# Altium footprint library 3.22-杂项.PcbLib: 199 footprints (part 10 of 15)
Each footprint in its own frame and in the unit in brackets; x right, y up, seen from the top. Pads: shape width x height; smd on the part's side, far side on the other; paste and mask are expansions set on the pad; w line width, h text height; cw(c..) or ccw(c..) is an arc to the next point about the centre after c.
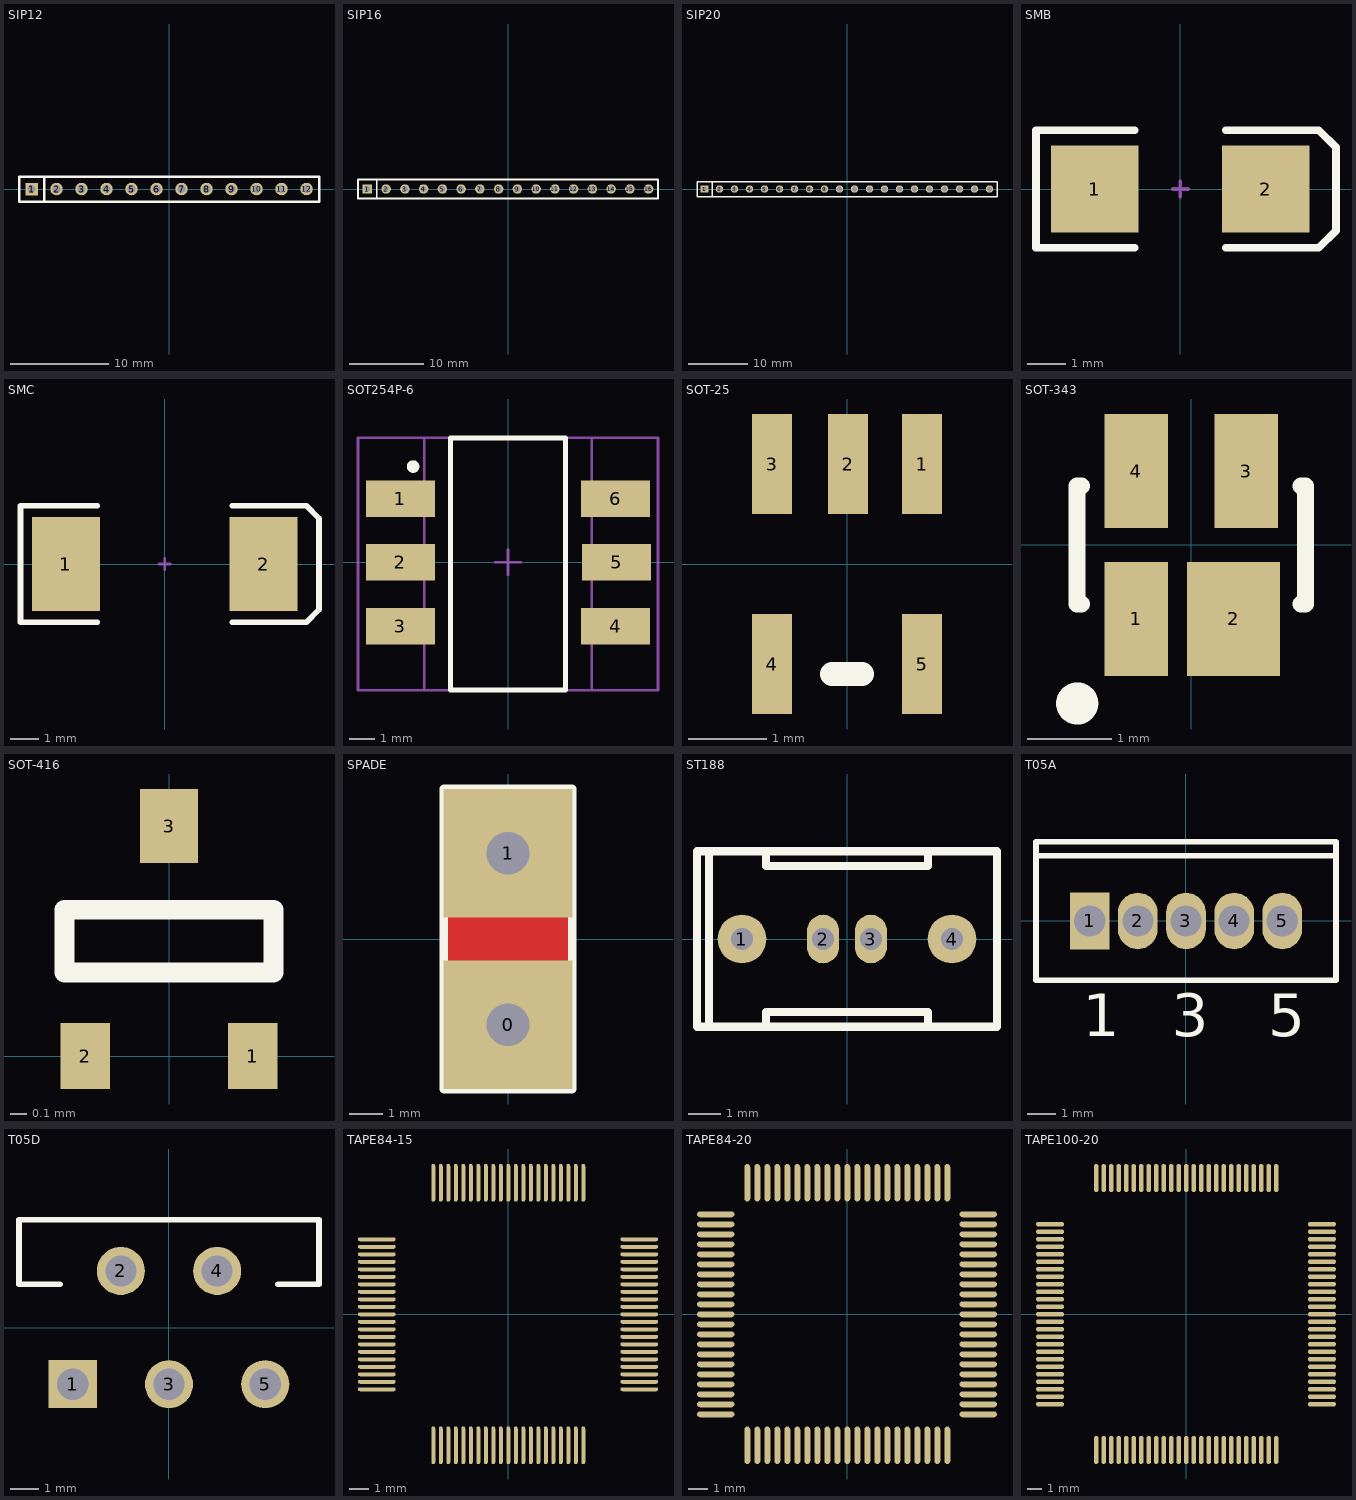
[diagram p9: the footprints below, top view; thin cyan lines are the x and y axes]

## SIP12 [mil] "[ PCBѧϰȺ514746572 ]"
pads (12):
  rect 50x50 hole 32: 1(-550,0)
  round 50 hole 32: 2(-450,0) 3(-350,0) 4(-250,0) 5(-150,0) 6(-50,0) 7(50,0) 8(150,0) 9(250,0) 10(350,0) 11(450,0) 12(550,0)
Top Overlay:
  lines w10: -500,-50 -500,50 ; -600,-50 600,-50 600,50 -600,50 -600,-50

## SIP16 [mil] "[ PCBѧϰȺ514746572 ]"
pads (16):
  rect 50x50 hole 32: 1(-750,0)
  round 50 hole 32: 2(-650,0) 3(-550,0) 4(-450,0) 5(-350,0) 6(-250,0) 7(-150,0) 8(-50,0) 9(50,0) 10(150,0) 11(250,0) 12(350,0) 13(450,0) 14(550,0) 15(650,0) 16(750,0)
Top Overlay:
  lines w10: -700,-50 -700,50 ; -800,-50 -800,50 800,50 800,-50 -800,-50

## SIP20 [mil] "[ PCBѧϰȺ514746572 ]"
pads (20):
  rect 50x50 hole 32: 1(-950,0)
  round 50 hole 32: 2(-850,0) 3(-750,0) 4(-650,0) 5(-550,0) 6(-450,0) 7(-350,0) 8(-250,0) 9(-150,0) 10(-50,0) 11(50,0) 12(150,0) 13(250,0) 14(350,0) 15(450,0) 16(550,0) 17(650,0) 18(750,0) 19(850,0) 20(950,0)
Top Overlay:
  lines w10: -900,-50 -900,50 ; -1000,-50 -1000,50 1000,50 1000,-50 -1000,-50

## SMB [mm] "DO-214-AA/SMB; 2 C-Bend Leads; Body 5.3 x 3.6 mm, inc. leads (LxW)      [ PCBѧϰȺ514746572 ]"
height 2.54
pads (2):
  rect 2.3x2.3 smd: 1(-2.25,0) 2(2.25,0)
Top Overlay:
  lines w0.2: -1.2,-1.55 -3.8,-1.55 -3.8,1.55 -1.2,1.55 ; 1.2,-1.55 3.65,-1.55 4.1,-1.1 4.1,1.1 3.65,1.55 1.2,1.55
Mechanical 1:
  lines w0.1: -0.2,0 0.2,0 ; 0,-0.2 0,0.2

## SMC [mm] "DO-214-AB/SMC; 2 C-Bend Leads; Body 7.9 x 5.9 mm, inc. leads (LxW)      [ PCBѧϰȺ514746572 ]"
height 2.65
pads (2):
  rect 2.4x3.3 smd: 1(-3.475,0) 2(3.475,0)
Top Overlay:
  lines w0.2: -2.375,-2.05 -5.075,-2.05 -5.075,2.05 -2.375,2.05 ; 2.375,-2.05 4.975,-2.05 5.425,-1.6 5.425,1.6 4.975,2.055 ; 2.375,2.05 4.975,2.05
Mechanical 1:
  lines w0.1: -0.2,0 0.2,0 ; 0,-0.2 0,0.2

## SOT254P-6 [mm] "继电器      [ PCB学习群514746572 ]"
height 3.8
pads (6):
  rect 2.75x1.45 smd: 1(-4.283,2.54) 2(-4.283,0) 3(-4.283,-2.54) 4(4.283,-2.54) 5(4.318,0) 6(4.283,2.54)
Top Overlay:
  circle w0.25: c-3.775,3.815 r0.125
  lines w0.2: -2.286,-5.08 -2.286,4.953 2.286,4.953 2.286,-5.08 -2.286,-5.08
Mechanical 13:
  lines w0.1: -3.325,-5.08 3.325,-5.08 3.325,4.953 -3.325,4.953 -3.325,-5.08
Mechanical 15:
  lines w0.1: -0.5,0 0.5,0 ; 0,-0.5 0,0.5 ; -5.969,-5.08 5.969,-5.08 5.969,4.953 -5.969,4.953 -5.969,-5.08
3D body: height 3.8, standoff 0.05, extent -3.325,-5.08 3.325,4.953

## SOT-25 [mil] "[ PCBѧϰȺ514746572 ]"
pads (5):
  rect 20x50 smd: 1(37.5,50) 2(0.5,50) 3(-37.5,50) 4(-37.5,-50) 5(37.5,-50)
Top Overlay:
  lines w12: -7.5,-55 7.5,-55

## SOT-343 [mm] "SOT-343; 4 Leads; Body 2.2 x 2.2 mm, inc. leads (LxW max)      [ PCBѧϰȺ514746572 ]"
height 1
pads (4):
  rect 0.75x1.35 smd: 1(-0.65,-0.875) 3(0.65,0.875) 4(-0.65,0.875)
  rect 1.1x1.35 smd: 2(0.5,-0.875)
Top Overlay:
  circle w0.25: c-1.35,-1.875 r0.125
  lines w0.2: -1.3,-0.7 -1.35,-0.7 -1.35,0.7 -1.3,0.7 ; 1.3,-0.7 1.35,-0.7 1.35,0.7 1.3,0.7

## SOT-416 [mm] "[ PCBѧϰȺ514746572 ]"
height 0.7
pads (3):
  rect 0.3x0.4 smd: 1(0.508,0) 2(-0.508,0)
  rect 0.35x0.45 smd: 3(0,1.397)
Top Overlay:
  lines w0.12: -0.635,0.508 -0.635,0.889 0.635,0.889 0.635,0.508 -0.635,0.508

## SPADE [mil] "[ PCBѧϰȺ514746572 ]"
pads (2):
  rect 150x150 hole 50: 0(0,-100) 1(0,100)
Top Layer:
  rectangle: -75,-50 75,50
Bottom Layer:
  rectangle: -75,-50 75,50
Top Overlay:
  lines w10: -75,-175 75,-175 75,175 -75,175 -75,-175

## ST188 [mm] "反射式光电传感器      [ PCB学习群514746572 ]"
height 8.2
pads (4):
  round 1.524 hole 0.7: 1(-3.29,0) 4(3.29,0)
  oval 1x1.524 hole 0.7: 2(-0.75,0) 3(0.75,0)
Top Overlay:
  lines w0.254: -4.318,-2.75 -4.318,2.75 ; -2.54,-2.75 -2.54,-2.286 2.54,-2.286 2.54,-2.75 ; -2.54,2.75 -2.54,2.286 2.54,2.286 2.54,2.75 ; -4.7,-2.75 4.7,-2.75 4.7,2.75 -4.7,2.75 -4.7,-2.75

## T05A [mm] "TO, Thru-Hole, Vertical, Heatsink Mounted; 5 In-Line Leads; Pitch 1.70 mm      [ PCBѧϰȺ514746572 ]"
height 15.9
pads (5):
  rect 1.4x2 hole 1.1: 1(-3.4,0)
  oval 1.4x2 hole 1.1: 2(-1.7,0) 3(0,0) 4(1.7,0) 5(3.4,0)
Top Overlay:
  lines w0.2: -5.3,2.3 5.3,2.3 ; -5.3,-2.1 -5.3,2.8 5.3,2.8 5.3,-2.1 -5.3,-2.1
  text "5" at 2.9,-4.075 h1.5
  text "3" at -0.5,-4.075 h1.5
  text "1" at -3.65,-4.075 h1.5

## T05D [mm] "[ PCBѧϰȺ514746572 ]"
height 21.1
pads (5):
  rect 1.7x1.7 hole 1.1: 1(-3.4,-2)
  round 1.7 hole 1.1: 2(-1.7,2) 3(0,-2) 4(1.7,2) 5(3.4,-2)
Top Overlay:
  lines w0.2: -3.854,1.53 -5.3,1.53 -5.3,3.81 5.3,3.81 5.3,1.53 3.854,1.53

## TAPE84-15 [mil] "[ PCBѧϰȺ514746572 ]"
pads (84):
  oval 75x8 smd: 1(-262.5,149.5) 2(-262.5,134.5) 3(-262.5,119.5) 4(-262.5,104.5) 5(-262.5,89.5) 6(-262.5,74.5) 7(-262.5,59.5) 8(-262.5,44.5) 9(-262.5,29.5) 10(-262.5,14.5) 11(-262.5,-0.5) 12(-262.5,-15.5) 13(-262.5,-30.5) 14(-262.5,-45.5) 15(-262.5,-60.5) 16(-262.5,-75.5) 17(-262.5,-90.5) 18(-262.5,-105.5) 19(-262.5,-120.5) 20(-262.5,-135.5) 21(-262.5,-150.5) 43(262.5,-150.5) 44(262.5,-135.5) 45(262.5,-120.5) 46(262.5,-105.5) 47(262.5,-90.5) 48(262.5,-75.5) 49(262.5,-60.5) 50(262.5,-45.5) 51(262.5,-30.5) 52(262.5,-15.5) 53(262.5,-0.5) 54(262.5,14.5) 55(262.5,29.5) 56(262.5,44.5) 57(262.5,59.5) 58(262.5,74.5) 59(262.5,89.5) 60(262.5,104.5) 61(262.5,119.5) 62(262.5,134.5) 63(262.5,149.5)
  oval 8x75 smd: 22(-149.5,-262.5) 23(-134.5,-262.5) 24(-119.5,-262.5) 25(-104.5,-262.5) 26(-89.5,-262.5) 27(-74.5,-262.5) 28(-59.5,-262.5) 29(-44.5,-262.5) 30(-29.5,-262.5) 31(-14.5,-262.5) 32(0.5,-262.5) 33(15.5,-262.5) 34(30.5,-262.5) 35(45.5,-262.5) 36(60.5,-262.5) 37(75.5,-262.5) 38(90.5,-262.5) 39(105.5,-262.5) 40(120.5,-262.5) 41(135.5,-262.5) 42(150.5,-262.5) 64(150.5,262.5) 65(135.5,262.5) 66(120.5,262.5) 67(105.5,262.5) 68(90.5,262.5) 69(75.5,262.5) 70(60.5,262.5) 71(45.5,262.5) 72(30.5,262.5) 73(15.5,262.5) 74(0.5,262.5) 75(-14.5,262.5) 76(-29.5,262.5) 77(-44.5,262.5) 78(-59.5,262.5) 79(-74.5,262.5) 80(-89.5,262.5) 81(-104.5,262.5) 82(-119.5,262.5) 83(-134.5,262.5) 84(-149.5,262.5)

## TAPE84-20 [mil] "[ PCBѧϰȺ514746572 ]"
pads (84):
  oval 75x12 smd: 1(-262.5,199.5) 2(-262.5,179.5) 3(-262.5,159.5) 4(-262.5,139.5) 5(-262.5,119.5) 6(-262.5,99.5) 7(-262.5,79.5) 8(-262.5,59.5) 9(-262.5,39.5) 10(-262.5,19.5) 11(-262.5,-0.5) 12(-262.5,-20.5) 13(-262.5,-40.5) 14(-262.5,-60.5) 15(-262.5,-80.5) 16(-262.5,-100.5) 17(-262.5,-120.5) 18(-262.5,-140.5) 19(-262.5,-160.5) 20(-262.5,-180.5) 21(-262.5,-200.5) 43(262.5,-200.5) 44(262.5,-180.5) 45(262.5,-160.5) 46(262.5,-140.5) 47(262.5,-120.5) 48(262.5,-100.5) 49(262.5,-80.5) 50(262.5,-60.5) 51(262.5,-40.5) 52(262.5,-20.5) 53(262.5,-0.5) 54(262.5,19.5) 55(262.5,39.5) 56(262.5,59.5) 57(262.5,79.5) 58(262.5,99.5) 59(262.5,119.5) 60(262.5,139.5) 61(262.5,159.5) 62(262.5,179.5) 63(262.5,199.5)
  oval 12x75 smd: 22(-199.5,-262.5) 23(-179.5,-262.5) 24(-159.5,-262.5) 25(-139.5,-262.5) 26(-119.5,-262.5) 27(-99.5,-262.5) 28(-79.5,-262.5) 29(-59.5,-262.5) 30(-39.5,-262.5) 31(-19.5,-262.5) 32(0.5,-262.5) 33(20.5,-262.5) 34(40.5,-262.5) 35(60.5,-262.5) 36(80.5,-262.5) 37(100.5,-262.5) 38(120.5,-262.5) 39(140.5,-262.5) 40(160.5,-262.5) 41(180.5,-262.5) 42(200.5,-262.5) 64(200.5,262.5) 65(180.5,262.5) 66(160.5,262.5) 67(140.5,262.5) 68(120.5,262.5) 69(100.5,262.5) 70(80.5,262.5) 71(60.5,262.5) 72(40.5,262.5) 73(20.5,262.5) 74(0.5,262.5) 75(-19.5,262.5) 76(-39.5,262.5) 77(-59.5,262.5) 78(-79.5,262.5) 79(-99.5,262.5) 80(-119.5,262.5) 81(-139.5,262.5) 82(-159.5,262.5) 83(-179.5,262.5) 84(-199.5,262.5)

## TAPE100-20 [mil] "[ PCBѧϰȺ514746572 ]"
pads (100):
  oval 75x12 smd: 1(-362.5,239.5) 2(-362.5,219.5) 3(-362.5,199.5) 4(-362.5,179.5) 5(-362.5,159.5) 6(-362.5,139.5) 7(-362.5,119.5) 8(-362.5,99.5) 9(-362.5,79.5) 10(-362.5,59.5) 11(-362.5,39.5) 12(-362.5,19.5) 13(-362.5,-0.5) 14(-362.5,-20.5) 15(-362.5,-40.5) 16(-362.5,-60.5) 17(-362.5,-80.5) 18(-362.5,-100.5) 19(-362.5,-120.5) 20(-362.5,-140.5) 21(-362.5,-160.5) 22(-362.5,-180.5) 23(-362.5,-200.5) 24(-362.5,-220.5) 25(-362.5,-240.5) 51(362.5,-240.5) 52(362.5,-220.5) 53(362.5,-200.5) 54(362.5,-180.5) 55(362.5,-160.5) 56(362.5,-140.5) 57(362.5,-120.5) 58(362.5,-100.5) 59(362.5,-80.5) 60(362.5,-60.5) 61(362.5,-40.5) 62(362.5,-20.5) 63(362.5,-0.5) 64(362.5,19.5) 65(362.5,39.5) 66(362.5,59.5) 67(362.5,79.5) 68(362.5,99.5) 69(362.5,119.5) 70(362.5,139.5) 71(362.5,159.5) 72(362.5,179.5) 73(362.5,199.5) 74(362.5,219.5) 75(362.5,239.5)
  oval 12x75 smd: 26(-239.5,-362.5) 27(-219.5,-362.5) 28(-199.5,-362.5) 29(-179.5,-362.5) 30(-159.5,-362.5) 31(-139.5,-362.5) 32(-119.5,-362.5) 33(-99.5,-362.5) 34(-79.5,-362.5) 35(-59.5,-362.5) 36(-39.5,-362.5) 37(-19.5,-362.5) 38(0.5,-362.5) 39(20.5,-362.5) 40(40.5,-362.5) 41(60.5,-362.5) 42(80.5,-362.5) 43(100.5,-362.5) 44(120.5,-362.5) 45(140.5,-362.5) 46(160.5,-362.5) 47(180.5,-362.5) 48(200.5,-362.5) 49(220.5,-362.5) 50(240.5,-362.5) 76(240.5,362.5) 77(220.5,362.5) 78(200.5,362.5) 79(180.5,362.5) 80(160.5,362.5) 81(140.5,362.5) 82(120.5,362.5) 83(100.5,362.5) 84(80.5,362.5) 85(60.5,362.5) 86(40.5,362.5) 87(20.5,362.5) 88(0.5,362.5) 89(-19.5,362.5) 90(-39.5,362.5) 91(-59.5,362.5) 92(-79.5,362.5) 93(-99.5,362.5) 94(-119.5,362.5) 95(-139.5,362.5) 96(-159.5,362.5) 97(-179.5,362.5) 98(-199.5,362.5) 99(-219.5,362.5) 100(-239.5,362.5)